# Altium footprint library SOP封装库.PcbLib: 52 footprints (part 2 of 4)
Each footprint in its own frame and in the unit in brackets; x right, y up, seen from the top. Pads: shape width x height; smd on the part's side, far side on the other; paste and mask are expansions set on the pad; w line width, h text height; cw(c..) or ccw(c..) is an arc to the next point about the centre after c.
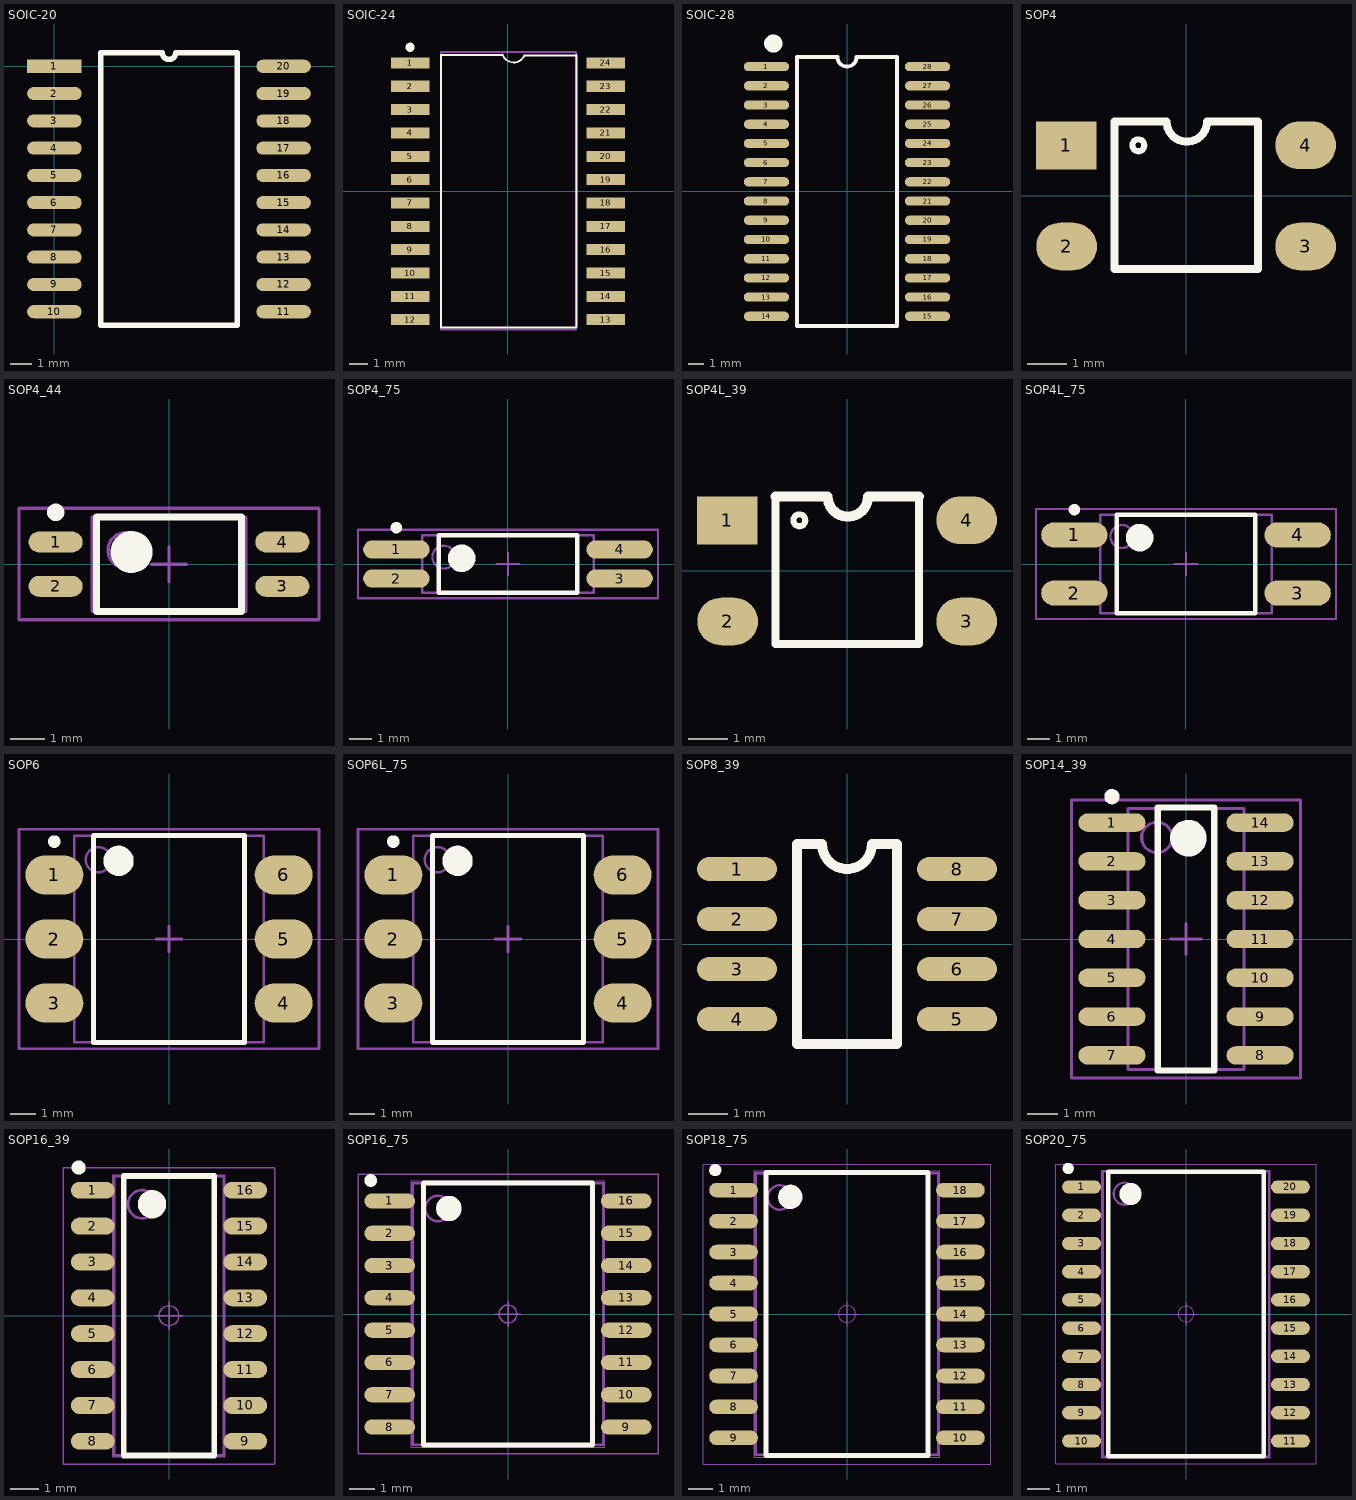
[diagram p1: the footprints below, top view; thin cyan lines are the x and y axes]

## SOIC-20 [mil]
height 39.37
pads (20):
  rect 100x24 smd: 1(0,0)
  oval 100x24 smd: 2(0,-50) 3(0,-100) 4(0,-150) 5(0,-200) 6(0,-250) 7(0,-300) 8(0,-350) 9(0,-400) 10(0,-450) 11(420,-450) 12(420,-400) 13(420,-350) 14(420,-300) 15(420,-250) 16(420,-200) 17(420,-150) 18(420,-100) 19(420,-50) 20(420,0)
Top Overlay:
  lines w10: 85,-475 335,-475 335,25 222.5,25 cw(c210,25) 197.5,25 85,25 85,-475
3D body: height 101.38, standoff -0.98, extent 1.34,-480.9 418.66,30.91

## SOIC-24 [mm]
pads (24):
  rect 2.1x0.6 smd: 1(-5.325,6.985) 2(-5.325,5.715) 3(-5.325,4.445) 4(-5.325,3.175) 5(-5.325,1.905) 6(-5.325,0.635) 7(-5.325,-0.635) 8(-5.325,-1.905) 9(-5.325,-3.175) 10(-5.325,-4.445) 11(-5.325,-5.715) 12(-5.325,-6.985) 13(5.325,-6.985) 14(5.325,-5.715) 15(5.325,-4.445) 16(5.325,-3.175) 17(5.325,-1.905) 18(5.325,-0.635) 19(5.325,0.635) 20(5.325,1.905) 21(5.325,3.175) 22(5.325,4.445) 23(5.325,5.715) 24(5.325,6.985)
Top Overlay:
  circle w0.25: c-5.325,7.835 r0.125
  lines w0.102: -0.347,7.417 -3.649,7.417 -3.649,-7.417 3.692,-7.417 3.717,-7.391 3.717,7.417 ; -0.294,7.435 ccw(c0.308,7.647) 0.897,7.402 ; 0.923,7.391 3.692,7.391
Mechanical 15:
  lines w0.1: -3.649,-7.518 3.7,-7.518 3.7,7.569 -3.649,7.569 -3.649,-7.518
3D body: height 2.8, standoff 0.01, extent -5.246,-7.798 5.112,7.802

## SOIC-28 [mil]
pads (28):
  oval 118.11x24 smd: 1(-209.69,325) 2(-209.69,275) 3(-209.69,225) 4(-209.69,175) 5(-209.69,125) 6(-209.69,75) 7(-209.69,25) 8(-209.69,-25) 9(-209.69,-75) 10(-209.69,-125) 11(-209.69,-175) 12(-209.69,-225) 13(-209.69,-275) 14(-209.69,-325) 15(209.69,-325) 16(209.69,-275) 17(209.69,-225) 18(209.69,-175) 19(209.69,-125) 20(209.69,-75) 21(209.69,-25) 22(209.69,25) 23(209.69,75) 24(209.69,125) 25(209.69,175) 26(209.69,225) 27(209.69,275) 28(209.69,325)
Top Overlay:
  circle w23.62: c-191.81,385 r11.81
  lines w10: -130,-350 130,-350 130,350 25,350 cw(c0,350) -25,350 -130,350 -130,-350
3D body: height 100.79, standoff -0.67, extent -209,-353.33 206.48,355.33

## SOP4 [mil]
height 78.35
pads (4):
  rect 60x47.24 smd: 1(-118.25,49.9)
  oval 60x47.24 smd: 2(-117.97,-50) 3(118.25,-50) 4(118.25,50)
Top Overlay:
  circle w5.91: c-47.1,50 r5.91
  lines w7.87: -70.72,-72.05 -70.72,73.62 -19.2,73.62 ccw(c0.8,73.62) 20.8,73.62 71.01,73.62 71.01,-72.05 -70.72,-72.05
3D body: height 114.17, standoff 0.11, extent -131.75,-95.97 131.46,98.91

## SOP4_44 [mm] "SOP, 4-Leads, Body 2.7x4.4mm (max), Pitch 1.27mm, IPC Medium Density"
height 2
pads (4):
  oval 1.55x0.6 smd: 1(-3.25,0.635) 2(-3.25,-0.635) 3(3.25,-0.635) 4(3.25,0.635)
Top Overlay:
  circle w0.6: c-1.075,0.35 r0.3
  circle w0.25: c-3.25,1.485 r0.125
  lines w0.2: -2.075,-1.35 2.075,-1.35 2.075,1.35 -2.075,1.35 -2.075,-1.35
Mechanical 13:
  circle w0.1: c-1.25,0.4 r0.5
  lines w0.1: -2.2,-1.35 2.2,-1.35 2.2,1.35 -2.2,1.35 -2.2,-1.35
Mechanical 15:
  lines w0.1: -0.5,0 0.5,0 ; 0,-0.5 0,0.5 ; -4.3,-1.6 4.3,-1.6 4.3,1.6 -4.3,1.6 -4.3,-1.6
3D body: height 2.1, standoff 0, extent -3.551,-1.422 3.449,1.378

## SOP4_75 [mm] "SOP, 4-Leads, Body 2.5x7.5mm (max), Pitch 1.27mm, IPC Medium Density"
height 2
pads (4):
  oval 2.9x0.8 smd: 1(-4.875,0.635) 2(-4.875,-0.635) 3(4.875,-0.635) 4(4.875,0.635)
Top Overlay:
  circle w0.6: c-2.025,0.25 r0.3
  circle w0.25: c-4.875,1.585 r0.125
  lines w0.2: -3.025,-1.25 3.025,-1.25 3.025,1.25 -3.025,1.25 -3.025,-1.25
Mechanical 13:
  circle w0.1: c-2.8,0.3 r0.5
  lines w0.1: -3.75,-1.25 3.75,-1.25 3.75,1.25 -3.75,1.25 -3.75,-1.25
Mechanical 15:
  lines w0.1: -0.5,0 0.5,0 ; 0,-0.5 0,0.5 ; -6.55,-1.5 6.55,-1.5 6.55,1.5 -6.55,1.5 -6.55,-1.5
3D body: height 2, standoff 0.1, extent -3.75,-1.25 3.75,1.25

## SOP4L_39 [mil]
height 78.35
pads (4):
  rect 60x47.24 smd: 1(-118.25,49.9)
  oval 60x47.24 smd: 2(-117.97,-50) 3(118.25,-50) 4(118.25,50)
Top Overlay:
  circle w5.91: c-47.1,50 r5.91
  lines w7.87: -70.72,73.62 -70.72,-72.05 71.01,-72.05 71.01,73.62
  lines w10: -70.72,73.62 -19.2,73.62 ccw(c0.8,73.62) 20.8,73.62 71.01,73.62
3D body: height 114.17, standoff 0.11, extent -131.75,-95.97 131.46,98.91

## SOP4L_75 [mm] "SOP, 4-Leads, Body 4.3x7.5mm (max), Pitch 2.54mm, IPC Medium Density"
height 2
pads (4):
  oval 2.9x1.1 smd: 1(-4.875,1.27) 2(-4.875,-1.27) 3(4.875,-1.27) 4(4.875,1.27)
Top Overlay:
  circle w0.25: c-4.875,2.37 r0.125
  circle w0.6: c-2.025,1.15 r0.3
  lines w0.2: -3.025,-2.15 -3.025,2.15 3.025,2.15 3.025,-2.15 -3.025,-2.15
Mechanical 13:
  circle w0.1: c-2.8,1.2 r0.5
  lines w0.1: -3.75,-2.15 -3.75,2.15 3.75,2.15 3.75,-2.15 -3.75,-2.15
Mechanical 15:
  lines w0.1: -0.5,0 0.5,0 ; 0,-0.5 0,0.5 ; -6.55,-2.4 -6.55,2.4 6.55,2.4 6.55,-2.4 -6.55,-2.4
3D body: height 1, standoff -1.12, extent -5.227,-2.05 4.973,2.05

## SOP6 [mm] "SOP, 6-Leads, Body 8.2x7.5mm (max), Pitch 2.54mm, IPC Medium Density"
height 2.65
pads (6):
  oval 2.3x1.55 smd: 1(-4.55,2.54) 2(-4.55,0) 3(-4.55,-2.54) 4(4.55,-2.54) 5(4.55,0) 6(4.55,2.54)
Top Overlay:
  circle w0.6: c-2,3.1 r0.3
  circle w0.25: c-4.55,3.865 r0.125
  lines w0.2: -3,-4.1 3,-4.1 3,4.1 -3,4.1 -3,-4.1
Mechanical 13:
  circle w0.1: c-2.8,3.145 r0.5
  lines w0.1: -3.75,-4.095 3.75,-4.095 3.75,4.095 -3.75,4.095 -3.75,-4.095
Mechanical 15:
  lines w0.1: -0.5,0 0.5,0 ; 0,-0.5 0,0.5 ; -5.95,-4.35 5.95,-4.35 5.95,4.35 -5.95,4.35 -5.95,-4.35
3D body: height 4, standoff -0.08, extent -4.573,-4.27 4.593,4.24

## SOP6L_75 [mm] "SOP, 6-Leads, Body 8.2x7.5mm (max), Pitch 2.54mm, IPC Medium Density"
height 2.65
pads (6):
  oval 2.3x1.55 smd: 1(-4.55,2.54) 2(-4.55,0) 3(-4.55,-2.54) 4(4.55,-2.54) 5(4.55,0) 6(4.55,2.54)
Top Overlay:
  circle w0.6: c-2,3.1 r0.3
  circle w0.25: c-4.55,3.865 r0.125
  lines w0.2: -3,-4.1 3,-4.1 3,4.1 -3,4.1 -3,-4.1
Mechanical 13:
  circle w0.1: c-2.8,3.145 r0.5
  lines w0.1: -3.75,-4.095 3.75,-4.095 3.75,4.095 -3.75,4.095 -3.75,-4.095
Mechanical 15:
  lines w0.1: -0.5,0 0.5,0 ; 0,-0.5 0,0.5 ; -5.95,-4.35 5.95,-4.35 5.95,4.35 -5.95,4.35 -5.95,-4.35
3D body: height 4, standoff -0.08, extent -4.573,-4.27 4.593,4.24

## SOP8_39 [mil]
height 78.35
pads (8):
  oval 80x24 smd: 1(-110,75) 2(-110,25) 3(-110,-25) 4(-110,-75) 5(110,-75) 6(110,-25) 7(110,25) 8(110,75)
Top Overlay:
  lines w10: -50,-100 -50,100 -25,100 ccw(c0,100) 25,100 50,100 50,-100 -50,-100
3D body: height 67, standoff 0, extent -118,-94.99 118,95.01

## SOP14_39 [mm] "SOP, 14-Leads, Body 8.6x3.8mm (max), Pitch 1.27mm, IPC Medium Density"
height 1.75
pads (14):
  oval 2.2x0.6 smd: 1(-2.425,3.81) 2(-2.425,2.54) 3(-2.425,1.27) 4(-2.425,0) 5(-2.425,-1.27) 6(-2.425,-2.54) 7(-2.425,-3.81) 8(2.425,-3.81) 9(2.425,-2.54) 10(2.425,-1.27) 11(2.425,0) 12(2.425,1.27) 13(2.425,2.54) 14(2.425,3.81)
Top Overlay:
  circle w0.25: c-2.425,4.66 r0.125
  circle w0.6: c0.075,3.3 r0.3
  lines w0.2: -0.925,-4.3 -0.925,4.3 0.925,4.3 0.925,-4.3 -0.925,-4.3
Mechanical 13:
  circle w0.1: c-0.95,3.325 r0.5
  lines w0.1: -1.9,-4.275 -1.9,4.275 1.9,4.275 1.9,-4.275 -1.9,-4.275
Mechanical 15:
  lines w0.1: -0.5,0 0.5,0 ; 0,-0.5 0,0.5 ; -3.75,-4.55 -3.75,4.55 3.75,4.55 3.75,-4.55 -3.75,-4.55
3D body: height 1.75, standoff 0.1, extent -1.9,-4.275 1.9,4.275

## SOP16_39 [mm]
pads (16):
  oval 1.55x0.6 smd: 1(-2.7,4.445) 2(-2.7,3.175) 3(-2.7,1.905) 4(-2.7,0.635) 5(-2.7,-0.635) 6(-2.7,-1.905) 7(-2.7,-3.175) 8(-2.7,-4.445) 9(2.7,-4.445) 10(2.7,-3.175) 11(2.7,-1.905) 12(2.7,-0.635) 13(2.7,0.635) 14(2.7,1.905) 15(2.7,3.175) 16(2.7,4.445)
Top Overlay:
  circle w0.25: c-3.2,5.25 r0.125
  circle w0.5: c-0.6,3.95 r0.25
  lines w0.2: -1.6,-4.95 -1.6,4.95 1.6,4.95 1.6,-4.95 -1.6,-4.95
Mechanical 15:
  circle w0.1: c-0.95,3.95 r0.5
  lines w0.1: -1.95,-4.95 -1.95,4.95 1.95,4.95 1.95,-4.95 -1.95,-4.95
  text "1" at 0.45,-0.164 h0.75
Mechanical 16:
  circle w0.05: c0,0 r0.35
  lines w0.001: -1.995,-5 -1.995,5 1.995,5 1.995,-5 -1.995,-5
  lines w0.05: -0.5,0 0.5,0 ; 0,-0.5 0,0.5 ; -3.75,-5.25 -3.75,5.25 3.75,5.25 3.75,-5.25 -3.75,-5.25
3D body: height 0, standoff -1.4, extent -3,-4.95 3,4.95

## SOP16_75 [mm]
pads (16):
  oval 2x0.6 smd: 1(-4.65,4.445) 2(-4.65,3.175) 3(-4.65,1.905) 4(-4.65,0.635) 5(-4.65,-0.635) 6(-4.65,-1.905) 7(-4.65,-3.175) 8(-4.65,-4.445) 9(4.65,-4.445) 10(4.65,-3.175) 11(4.65,-1.905) 12(4.65,-0.635) 13(4.65,0.635) 14(4.65,1.905) 15(4.65,3.175) 16(4.65,4.445)
Top Overlay:
  circle w0.5: c-2.325,4.15 r0.25
  circle w0.25: c-5.4,5.25 r0.125
  lines w0.2: -3.325,-5.15 3.325,-5.15 3.325,5.15 -3.325,5.15 -3.325,-5.15
Mechanical 15:
  circle w0.1: c-2.75,4.15 r0.5
  lines w0.1: -3.75,-5.15 3.75,-5.15 3.75,5.15 -3.75,5.15 -3.75,-5.15
  text "1" at 0.45,-0.164 h0.75
Mechanical 16:
  circle w0.05: c0,0 r0.35
  lines w0.001: -3.8,-5.25 3.8,-5.25 3.8,5.25 -3.8,5.25 -3.8,-5.25
  lines w0.05: -0.5,0 0.5,0 ; 0,-0.5 0,0.5 ; -5.9,-5.5 5.9,-5.5 5.9,5.5 -5.9,5.5 -5.9,-5.5
3D body: height 2.65, standoff 0, extent -5.15,-5.15 5.15,5.15

## SOP18_75 [mm]
pads (18):
  oval 2x0.6 smd: 1(-4.65,5.08) 2(-4.65,3.81) 3(-4.65,2.54) 4(-4.65,1.27) 5(-4.65,0) 6(-4.65,-1.27) 7(-4.65,-2.54) 8(-4.65,-3.81) 9(-4.65,-5.08) 10(4.65,-5.08) 11(4.65,-3.81) 12(4.65,-2.54) 13(4.65,-1.27) 14(4.65,0) 15(4.65,1.27) 16(4.65,2.54) 17(4.65,3.81) 18(4.65,5.08)
Top Overlay:
  circle w0.25: c-5.4,5.9 r0.125
  circle w0.5: c-2.325,4.8 r0.25
  lines w0.2: -3.325,-5.8 -3.325,5.8 3.325,5.8 3.325,-5.8 -3.325,-5.8
Mechanical 15:
  circle w0.1: c-2.75,4.775 r0.5
  lines w0.1: -3.75,-5.775 -3.75,5.775 3.75,5.775 3.75,-5.775 -3.75,-5.775
  text "1" at 0.45,-0.164 h0.75
Mechanical 16:
  circle w0.05: c0,0 r0.35
  lines w0.001: -3.8,-5.875 -3.8,5.875 3.8,5.875 3.8,-5.875 -3.8,-5.875
  lines w0.05: -0.5,0 0.5,0 ; 0,-0.5 0,0.5 ; -5.9,-6.15 -5.9,6.15 5.9,6.15 5.9,-6.15 -5.9,-6.15

## SOP20_75 [mm]
pads (20):
  oval 1.75x0.6 smd: 1(-4.7,5.715) 2(-4.7,4.445) 3(-4.7,3.175) 4(-4.7,1.905) 5(-4.7,0.635) 6(-4.7,-0.635) 7(-4.7,-1.905) 8(-4.7,-3.175) 9(-4.7,-4.445) 10(-4.7,-5.715) 11(4.7,-5.715) 12(4.7,-4.445) 13(4.7,-3.175) 14(4.7,-1.905) 15(4.7,-0.635) 16(4.7,0.635) 17(4.7,1.905) 18(4.7,3.175) 19(4.7,4.445) 20(4.7,5.715)
Top Overlay:
  circle w0.5: c-2.5,5.4 r0.25
  circle w0.25: c-5.3,6.55 r0.125
  lines w0.2: -3.5,-6.4 3.5,-6.4 3.5,6.4 -3.5,6.4 -3.5,-6.4
Mechanical 15:
  circle w0.1: c-2.75,5.412 r0.5
  lines w0.1: -3.75,-6.412 3.75,-6.412 3.75,6.412 -3.75,6.412 -3.75,-6.412
  text "1" at 0.45,-0.164 h0.75
Mechanical 16:
  circle w0.05: c0,0 r0.35
  lines w0.001: -3.8,-6.475 3.8,-6.475 3.8,6.475 -3.8,6.475 -3.8,-6.475
  lines w0.05: -0.5,0 0.5,0 ; 0,-0.5 0,0.5 ; -5.85,-6.75 5.85,-6.75 5.85,6.75 -5.85,6.75 -5.85,-6.75